# Altium footprint library My_Library.PcbLib: 122 footprints (part 8 of 8)
Each footprint in its own frame and in the unit in brackets; x right, y up, seen from the top. Pads: shape width x height; smd on the part's side, far side on the other; paste and mask are expansions set on the pad; w line width, h text height; cw(c..) or ccw(c..) is an arc to the next point about the centre after c.
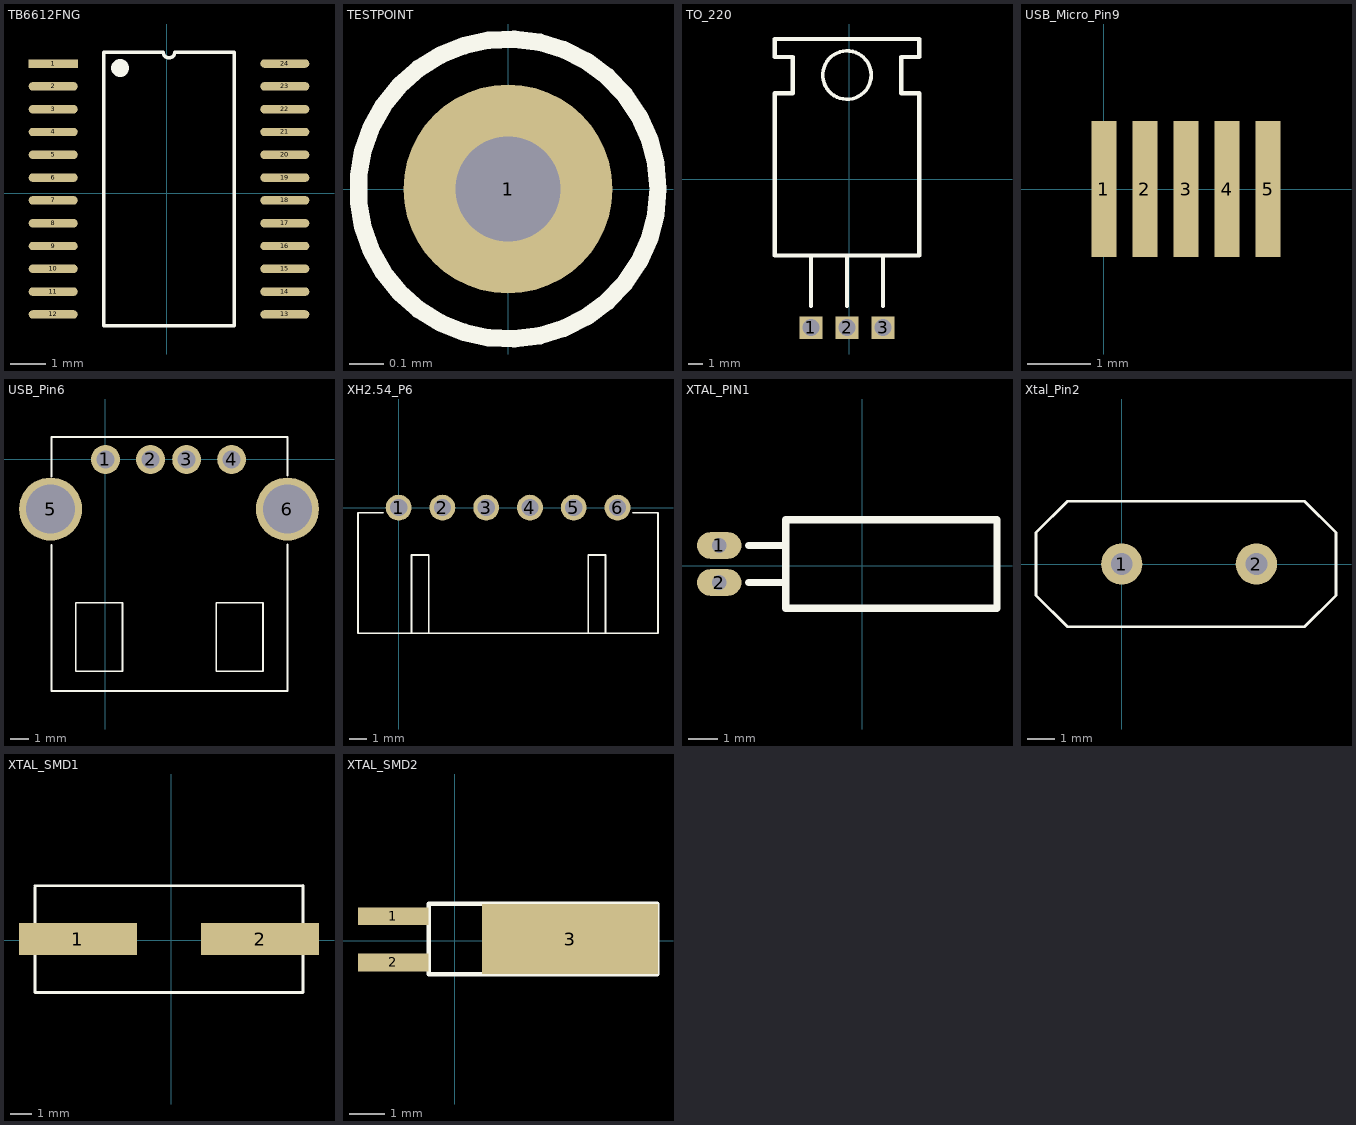
[diagram p7: the footprints below, top view; thin cyan lines are the x and y axes]

## TB6612FNG [mm]
pads (24):
  rect 1.4x0.24 smd: 1(-3.234,3.702)
  oval 1.4x0.24 smd: 2(-3.234,3.052) 3(-3.234,2.402) 4(-3.234,1.752) 5(-3.234,1.102) 6(-3.234,0.452) 7(-3.234,-0.198) 8(-3.234,-0.848) 9(-3.234,-1.498) 10(-3.234,-2.148) 11(-3.234,-2.798) 12(-3.234,-3.448) 13(3.366,-3.448) 14(3.366,-2.798) 15(3.366,-2.148) 16(3.366,-1.498) 17(3.366,-0.848) 18(3.366,-0.198) 19(3.366,0.452) 20(3.366,1.102) 21(3.366,1.752) 22(3.366,2.402) 23(3.366,3.052) 24(3.366,3.702)
Top Overlay:
  circle w0.254: c-1.329,3.575 r0.127
  lines w0.1: -1.799,-3.773 -1.799,4.027 -0.096,4.027 ccw(c0.066,4.027) 0.228,4.027 1.931,4.027 1.931,-3.773 -1.799,-3.773
3D body: height 0.04, standoff 0, extent -1.837,-3.791 1.973,4.083

## TESTPOINT [mm]
pads (1):
  round 0.6 hole 0.3: 1(0,0)
Top Overlay:
  circle w0.05: c0,0 r0.43

## TO_220 [mm]
pads (3):
  rect 1.6x1.6 hole 1.2: 1(-2.7,-10.45) 2(-0.16,-10.45) 3(2.38,-10.45)
Top Overlay:
  circle w0.254: c-0.16,7.33 r1.704
  lines w0.305: -2.7,-8.926 -2.7,-5.37 ; -0.16,-8.926 -0.16,-5.37 ; 2.38,-8.926 2.38,-5.37 ; -5.24,-5.37 -5.24,6.06 -3.97,6.06 -3.97,8.6 -5.24,8.6 -5.24,9.87 4.92,9.87 4.92,8.6 3.65,8.6 3.65,6.06 4.92,6.06 4.92,-5.37 -5.24,-5.37

## USB_Micro_Pin9 [mm]
pads (5):
  rect 0.4x2.15 smd: 1(0,0) 2(0.65,0) 3(1.3,0) 4(1.95,0) 5(2.6,0)

## USB_Pin6 [mm]
pads (6):
  round 1.6 hole 1: 1(0,0) 2(2.5,0) 3(4.5,0) 4(7,0)
  round 3.5 hole 2.7: 5(-3.05,-2.75) 6(10.1,-2.75)
Top Overlay:
  lines w0.1: -3,-4.75 -3,-12.85 10.1,-12.85 10.1,-4.7 ; -3,-0.95 -3,1.25 10.1,1.25 10.1,-0.9 ; -1.65,-11.75 0.95,-11.75 0.95,-8.15 0.95,-7.95 -1.65,-7.95 -1.65,-11.75 ; 6.15,-11.75 6.15,-7.95 8.75,-7.95 8.75,-8.15 8.75,-11.75 6.15,-11.75
3D body: height 6, standoff 0, extent -3,-12.85 10.1,1.25

## XH2.54_P6 [mm]
pads (6):
  round 1.5 hole 1: 1(0,0) 2(2.54,0) 3(5.08,0) 4(7.62,0) 5(10.16,0) 6(12.7,0)
Top Overlay:
  lines w0.1: -0.9,-0.3 -2.36,-0.3 -2.36,-5.93 -2.36,-6.3 -2.36,-7.3 15.05,-7.3 15.05,-6.3 15.05,-0.3 13.59,-0.3 ; 0.75,-7.3 0.75,-6.3 0.75,-2.75 1.75,-2.75 1.75,-6.3 1.75,-7.3 ; 11,-7.3 11,-6.3 11,-2.75 12,-2.75 12,-6.3 12,-7.3
3D body: height 5.5, standoff 0, extent -2.35,-7.3 15.05,-0.3

## XTAL_PIN1 [mil]
pads (2):
  oval 60x36 hole 20: 1(-192.91,27.56) 2(-192.91,-22.44)
Top Overlay:
  lines w10: -152.91,-22.44 -102.91,-22.44 ; -152.91,27.56 -102.91,27.56 ; -92.91,-57.44 -102.91,-57.44 ; -102.91,-57.44 132.09,-57.44 182.09,-57.44 182.09,62.56 132.09,62.56 -102.91,62.56 -102.91,-57.44

## Xtal_Pin2 [mm]
pads (2):
  round 1.5 hole 0.8: 1(0,0) 2(4.9,0)
Top Overlay:
  lines w0.1: -3.122,-1.143 -3.122,1.143 -1.979,2.286 6.657,2.286 7.8,1.143 7.8,-1.143 6.657,-2.286 -1.979,-2.286 -3.122,-1.143
3D body: height 3.5, standoff 0, extent -3.15,-2.3 7.8,2.3

## XTAL_SMD1 [mm]
pads (2):
  rect 5.5x1.5 smd: 1(-4.35,0.05) 2(4.15,0.05)
Top Overlay:
  lines w0.127: -6.357,2.539 6.15,2.55 6.15,-2.45 -6.25,-2.45 -6.35,-2.45 -6.35,2.45

## XTAL_SMD2 [mm]
pads (3):
  rect 2x0.5 smd: 1(-1.75,0.7) 2(-1.75,-0.621)
  rect 5x2 smd: 3(3.283,0.048)
Top Overlay:
  lines w0.127: -0.742,-0.952 3.258,-0.952 3.758,-0.952 5.758,-0.952 5.758,1.048 3.758,1.048 -0.742,1.048 -0.742,-0.952